# Altium integrated library HCxx.IntLib: 212 symbols (part 1 of 2) (continued)
## HC173 (continued)
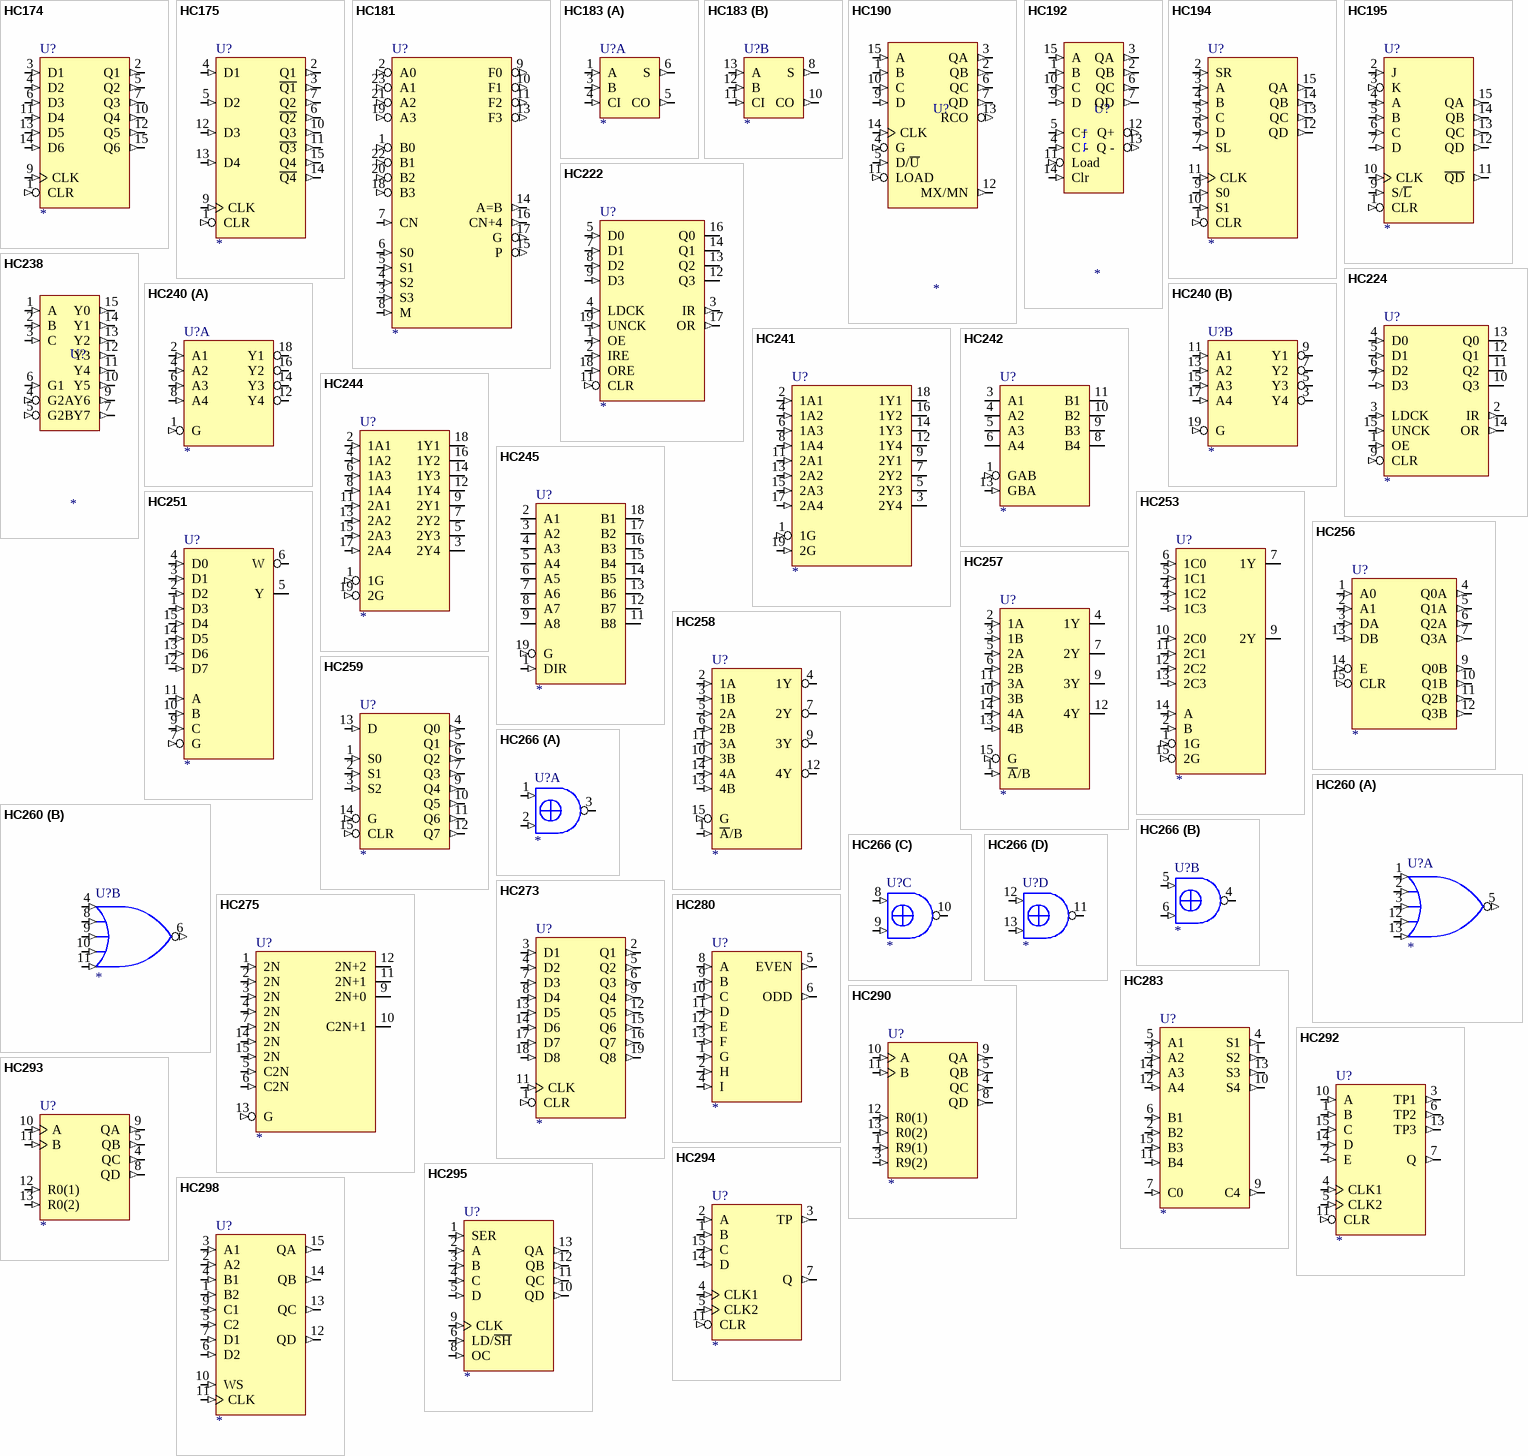
[diagram p4: symbols HC174 to HC298]

## HC174
designator U?
footprint DIL16-300
pins: 1 CLR (in), 2 Q1 (out), 3 D1 (in), 4 D2 (in), 5 Q2 (out), 6 D3 (in), 7 Q3 (out), 8 GND (power) hidden to GND, 9 CLK (in), 10 Q4 (out), 11 D4 (in), 12 Q5 (out), 13 D5 (in), 14 D6 (in), 15 Q6 (out), 16 VCC (power) hidden to VCC

## HC175
designator U?
footprint DIL16-300
pins: 1 CLR (in), 2 Q1 (out), 3 ~{Q1} (out), 4 D1 (in), 5 D2 (in), 6 ~{Q2} (out), 7 Q2 (out), 8 GND (power) hidden to GND, 9 CLK (in), 10 Q3 (out), 11 ~{Q3} (out), 12 D3 (in), 13 D4 (in), 14 ~{Q4} (out), 15 Q4 (out), 16 VCC (power) hidden to VCC

## HC181
designator U?
footprint DIL24-600
pins: 1 B0 (in), 2 A0 (in), 3 S3 (in), 4 S2 (in), 5 S1 (in), 6 S0 (in), 7 CN (in), 8 M (in), 9 F0 (out), 10 F1 (out), 11 F2 (out), 12 GND (power) hidden to GND, 13 F3 (out), 14 A=B (out), 15 P (out), 16 CN+4 (out), 17 G (out), 18 B3 (in), 19 A3 (in), 20 B2 (in), 21 A2 (in), 22 B1 (in), 23 A1 (in), 24 VCC (power) hidden to VCC

## HC183
designator U?
footprint DIL14-300
part A pins: 1 A (in), 3 B (in), 4 CI (in), 5 CO (out), 6 S (out), 7 GND (power) hidden to GND, 14 VCC (power) hidden to VCC
part B pins: 8 S (out), 10 CO (out), 11 CI (in), 12 B (in), 13 A (in)

## HC190
designator U?
footprint DIL16-300
pins: 1 B (in), 2 QB (out), 3 QA (out), 4 G (in), 5 D/~{U} (in), 6 QC (out), 7 QD (out), 8 GND (power) hidden to GND, 9 D (in), 10 C (in), 11 LOAD (in), 12 MX/MN (out), 13 RCO (out), 14 CLK (in), 15 A (in), 16 VCC (power) hidden to VCC

## HC192
designator U?
footprint DIL16-300
pins: 1 B (in), 2 QB (out), 3 QA (out), 4 C - (in), 5 C+ (in), 6 QC (out), 7 QD (out), 8 GND (power) hidden to GND, 9 D (in), 10 C (in), 11 Load (in), 12 Q+ (out), 13 Q - (out), 14 Clr (in), 15 A (in), 16 VCC (power) hidden to VCC

## HC194
designator U?
footprint DIL16-300
pins: 1 CLR (in), 2 SR (in), 3 A (in), 4 B (in), 5 C (in), 6 D (in), 7 SL (in), 8 GND (power) hidden to GND, 9 S0 (in), 10 S1 (in), 11 CLK (in), 12 QD (out), 13 QC (out), 14 QB (out), 15 QA (out), 16 VCC (power) hidden to VCC

## HC195
designator U?
footprint DIL16-300
pins: 1 CLR (in), 2 J (in), 3 K (in), 4 A (in), 5 B (in), 6 C (in), 7 D (in), 8 GND (power) hidden to GND, 9 S/~{L} (in), 10 CLK (in), 11 ~{QD} (out), 12 QD (out), 13 QC (out), 14 QB (out), 15 QA (out), 16 VCC (power) hidden to VCC

## HC222
designator U?
footprint DIL20-300
pins: 1 OE (in), 2 IRE (in), 3 IR (out), 4 LDCK (in), 5 D0 (in), 7 D1 (in), 8 D2 (in), 9 D3 (in), 10 GND (power) hidden to GND, 11 CLR (in), 12 Q3 (hiz), 13 Q2 (hiz), 14 Q1 (hiz), 16 Q0 (hiz), 17 OR (out), 18 ORE (in), 19 UNCK (in), 20 VCC (power) hidden to VCC

## HC224
designator U?
footprint DIL16-300
pins: 1 OE (in), 2 IR (out), 3 LDCK (in), 4 D0 (in), 5 D1 (in), 6 D2 (in), 7 D3 (in), 8 GND (power) hidden to GND, 9 CLR (in), 10 Q3 (hiz), 11 Q2 (hiz), 12 Q1 (hiz), 13 Q0 (hiz), 14 OR (out), 15 UNCK (in), 16 VCC (power) hidden to VCC

## HC238
designator U?
Price: 0.5
footprint DIL16-300
pins: 1 A (in), 2 B (in), 3 C (in), 4 G2A (in), 5 G2B (in), 6 G1 (in), 7 Y7 (out), 8 GND (power) hidden to GND, 9 Y6 (out), 10 Y5 (out), 11 Y4 (out), 12 Y3 (out), 13 Y2 (out), 14 Y1 (out), 15 Y0 (out), 16 VCC (power) hidden to VCC

## HC240
designator U?
footprint DIL20-300
part A pins: 1 G (in), 2 A1 (in), 4 A2 (in), 6 A3 (in), 8 A4 (in), 10 GND (power) hidden to GND, 12 Y4 (hiz), 14 Y3 (hiz), 16 Y2 (hiz), 18 Y1 (hiz), 20 VCC (power) hidden to VCC
part B pins: 3 Y4 (hiz), 5 Y3 (hiz), 7 Y2 (hiz), 9 Y1 (hiz), 11 A1 (in), 13 A2 (in), 15 A3 (in), 17 A4 (in), 19 G (in)

## HC241
designator U?
footprint DIL20-300
pins: 1 1G (in), 2 1A1 (in), 3 2Y4 (hiz), 4 1A2 (in), 5 2Y3 (hiz), 6 1A3 (in), 7 2Y2 (hiz), 8 1A4 (in), 9 2Y1 (hiz), 10 GND (power) hidden to GND, 11 2A1 (in), 12 1Y4 (hiz), 13 2A2 (in), 14 1Y3 (hiz), 15 2A3 (in), 16 1Y2 (hiz), 17 2A4 (in), 18 1Y1 (hiz), 19 2G (in), 20 VCC (power) hidden to VCC

## HC242
designator U?
footprint DIL20-300
pins: 1 GAB (in), 3 A1 (io), 4 A2 (io), 5 A3 (io), 6 A4 (io), 7 GND (power) hidden to GND, 8 B4 (io), 9 B3 (io), 10 B2 (io), 11 B1 (io), 13 GBA (in), 14 VCC (power) hidden to VCC

## HC244
designator U?
footprint DIL20-300
pins: 1 1G (in), 2 1A1 (in), 3 2Y4 (hiz), 4 1A2 (in), 5 2Y3 (hiz), 6 1A3 (in), 7 2Y2 (hiz), 8 1A4 (in), 9 2Y1 (hiz), 10 GND (power) hidden to GND, 11 2A1 (in), 12 1Y4 (hiz), 13 2A2 (in), 14 1Y3 (hiz), 15 2A3 (in), 16 1Y2 (hiz), 17 2A4 (in), 18 1Y1 (hiz), 19 2G (in), 20 VCC (power) hidden to VCC

## HC245
designator U?
footprint DIL20-300
pins: 1 DIR (in), 2 A1 (io), 3 A2 (io), 4 A3 (io), 5 A4 (io), 6 A5 (io), 7 A6 (io), 8 A7 (io), 9 A8 (io), 10 GND (power) hidden to GND, 11 B8 (io), 12 B7 (io), 13 B6 (io), 14 B5 (io), 15 B4 (io), 16 B3 (io), 17 B2 (io), 18 B1 (io), 19 G (in), 20 VCC (power) hidden to VCC

## HC251
designator U?
footprint DIL16-300
pins: 1 D3 (in), 2 D2 (in), 3 D1 (in), 4 D0 (in), 5 Y (hiz), 6 W (hiz), 7 G (in), 8 GND (power) hidden to GND, 9 C (in), 10 B (in), 11 A (in), 12 D7 (in), 13 D6 (in), 14 D5 (in), 15 D4 (in), 16 VCC (power) hidden to VCC

## HC253
designator U?
footprint DIL16-300
pins: 1 1G (in), 2 B (in), 3 1C3 (in), 4 1C2 (in), 5 1C1 (in), 6 1C0 (in), 7 1Y (hiz), 8 GND (power) hidden to GND, 9 2Y (hiz), 10 2C0 (in), 11 2C1 (in), 12 2C2 (in), 13 2C3 (in), 14 A (in), 15 2G (in), 16 VCC (power) hidden to VCC

## HC256
designator U?
footprint DIL16-300
pins: 1 A0 (in), 2 A1 (in), 3 DA (in), 4 Q0A (out), 5 Q1A (out), 6 Q2A (out), 7 Q3A (out), 8 GND (power) hidden to GND, 9 Q0B (out), 10 Q1B (out), 11 Q2B (out), 12 Q3B (out), 13 DB (in), 14 E (in), 15 CLR (in), 16 VCC (power) hidden to VCC

## HC257
designator U?
footprint DIL16-300
pins: 1 ~{A}/B (in), 2 1A (in), 3 1B (in), 4 1Y (hiz), 5 2A (in), 6 2B (in), 7 2Y (hiz), 8 GND (power) hidden to GND, 9 3Y (hiz), 10 3B (in), 11 3A (in), 12 4Y (hiz), 13 4B (in), 14 4A (in), 15 G (in), 16 VCC (power) hidden to VCC

## HC258
designator U?
footprint DIL16-300
pins: 1 ~{A}/B (in), 2 1A (in), 3 1B (in), 4 1Y (hiz), 5 2A (in), 6 2B (in), 7 2Y (hiz), 8 GND (power) hidden to GND, 9 3Y (hiz), 10 3B (in), 11 3A (in), 12 4Y (hiz), 13 4B (in), 14 4A (in), 15 G (in), 16 VCC (power) hidden to VCC

## HC259
designator U?
footprint DIL16-300
pins: 1 S0 (in), 2 S1 (in), 3 S2 (in), 4 Q0 (out), 5 Q1 (out), 6 Q2 (out), 7 Q3 (out), 8 GND (power) hidden to GND, 9 Q4 (out), 10 Q5 (out), 11 Q6 (out), 12 Q7 (out), 13 D (in), 14 G (in), 15 CLR (in), 16 VCC (power) hidden to VCC

## HC260
designator U?
footprint DIL14-300
part A pins: 1 I0 (in), 2 I1 (in), 3 I2 (in), 5 O (out), 7 GND (power) hidden to GND, 12 I3 (in), 13 I4 (in), 14 VCC (power) hidden to VCC
part B pins: 4 I0 (in), 6 O (out), 8 I1 (in), 9 I2 (in), 10 I3 (in), 11 I4 (in)
1 alternate drawing of the same symbol

## HC266
designator U?
footprint DIL14-300
part A pins: 1 I0 (in), 2 I1 (in), 3 O (oc), 7 GND (power) hidden to GND, 14 VCC (power) hidden to VCC
part B pins: 4 O (oc), 5 I0 (in), 6 I1 (in)
part C pins: 8 I0 (in), 9 I1 (in), 10 O (oc)
part D pins: 11 O (oc), 12 I0 (in), 13 I1 (in)

## HC273
designator U?
footprint DIL20-300
pins: 1 CLR (in), 2 Q1 (out), 3 D1 (in), 4 D2 (in), 5 Q2 (out), 6 Q3 (out), 7 D3 (in), 8 D4 (in), 9 Q4 (out), 10 GND (power) hidden to GND, 11 CLK (in), 12 Q5 (out), 13 D5 (in), 14 D6 (in), 15 Q6 (out), 16 Q7 (out), 17 D7 (in), 18 D8 (in), 19 Q8 (out), 20 VCC (power) hidden to VCC

## HC275
designator U?
footprint DIL16-300
pins: 1 2N (in), 2 2N (in), 3 2N (in), 4 2N (in), 5 C2N (in), 6 C2N (in), 7 2N (in), 8 GND (power) hidden to GND, 9 2N+0 (hiz), 10 C2N+1 (hiz), 11 2N+1 (hiz), 12 2N+2 (hiz), 13 G (in), 14 2N (in), 15 2N (in), 16 VCC (power) hidden to VCC

## HC280
designator U?
footprint DIL14-300
pins: 1 G (in), 2 H (in), 4 I (in), 5 EVEN (out), 6 ODD (out), 7 GND (power) hidden to GND, 8 A (in), 9 B (in), 10 C (in), 11 D (in), 12 E (in), 13 F (in), 14 VCC (power) hidden to VCC

## HC283
designator U?
footprint DIL16-300
pins: 1 S2 (out), 2 B2 (in), 3 A2 (in), 4 S1 (out), 5 A1 (in), 6 B1 (in), 7 C0 (in), 8 GND (power) hidden to GND, 9 C4 (out), 10 S4 (out), 11 B4 (in), 12 A4 (in), 13 S3 (out), 14 A3 (in), 15 B3 (in), 16 VCC (power) hidden to VCC

## HC290
designator U?
footprint DIL14-300
pins: 1 R9(1) (in), 3 R9(2) (in), 4 QC (out), 5 QB (out), 7 GND (power) hidden to GND, 8 QD (out), 9 QA (out), 10 A (in), 11 B (in), 12 R0(1) (in), 13 R0(2) (in), 14 VCC (power) hidden to VCC

## HC292
designator U?
footprint DIL16-300
pins: 1 B (in), 2 E (in), 3 TP1 (out), 4 CLK1 (in), 5 CLK2 (in), 6 TP2 (out), 7 Q (out), 8 GND (power) hidden to GND, 10 A (in), 11 CLR (in), 13 TP3 (out), 14 D (in), 15 C (in), 16 VCC (power) hidden to VCC

## HC293
designator U?
footprint DIL14-300
pins: 4 QC (out), 5 QB (out), 7 GND (power) hidden to GND, 8 QD (out), 9 QA (out), 10 A (in), 11 B (in), 12 R0(1) (in), 13 R0(2) (in), 14 VCC (power) hidden to VCC

## HC294
designator U?
footprint DIL16-300
pins: 1 B (in), 2 A (in), 3 TP (out), 4 CLK1 (in), 5 CLK2 (in), 7 Q (out), 8 GND (power) hidden to GND, 11 CLR (in), 14 D (in), 15 C (in), 16 VCC (power) hidden to VCC

## HC295
designator U?
footprint DIL14-300
pins: 1 SER (in), 2 A (in), 3 B (in), 4 C (in), 5 D (in), 6 LD/~{SH} (in), 7 GND (power) hidden to GND, 8 OC (in), 9 CLK (in), 10 QD (out), 11 QC (out), 12 QB (out), 13 QA (out), 14 VCC (power) hidden to VCC

## HC298
designator U?
footprint DIL16-300
pins: 1 B2 (in), 2 A2 (in), 3 A1 (in), 4 B1 (in), 5 C2 (in), 6 D2 (in), 7 D1 (in), 8 GND (power) hidden to GND, 9 C1 (in), 10 WS (in), 11 CLK (in), 12 QD (out), 13 QC (out), 14 QB (out), 15 QA (out), 16 VCC (power) hidden to VCC

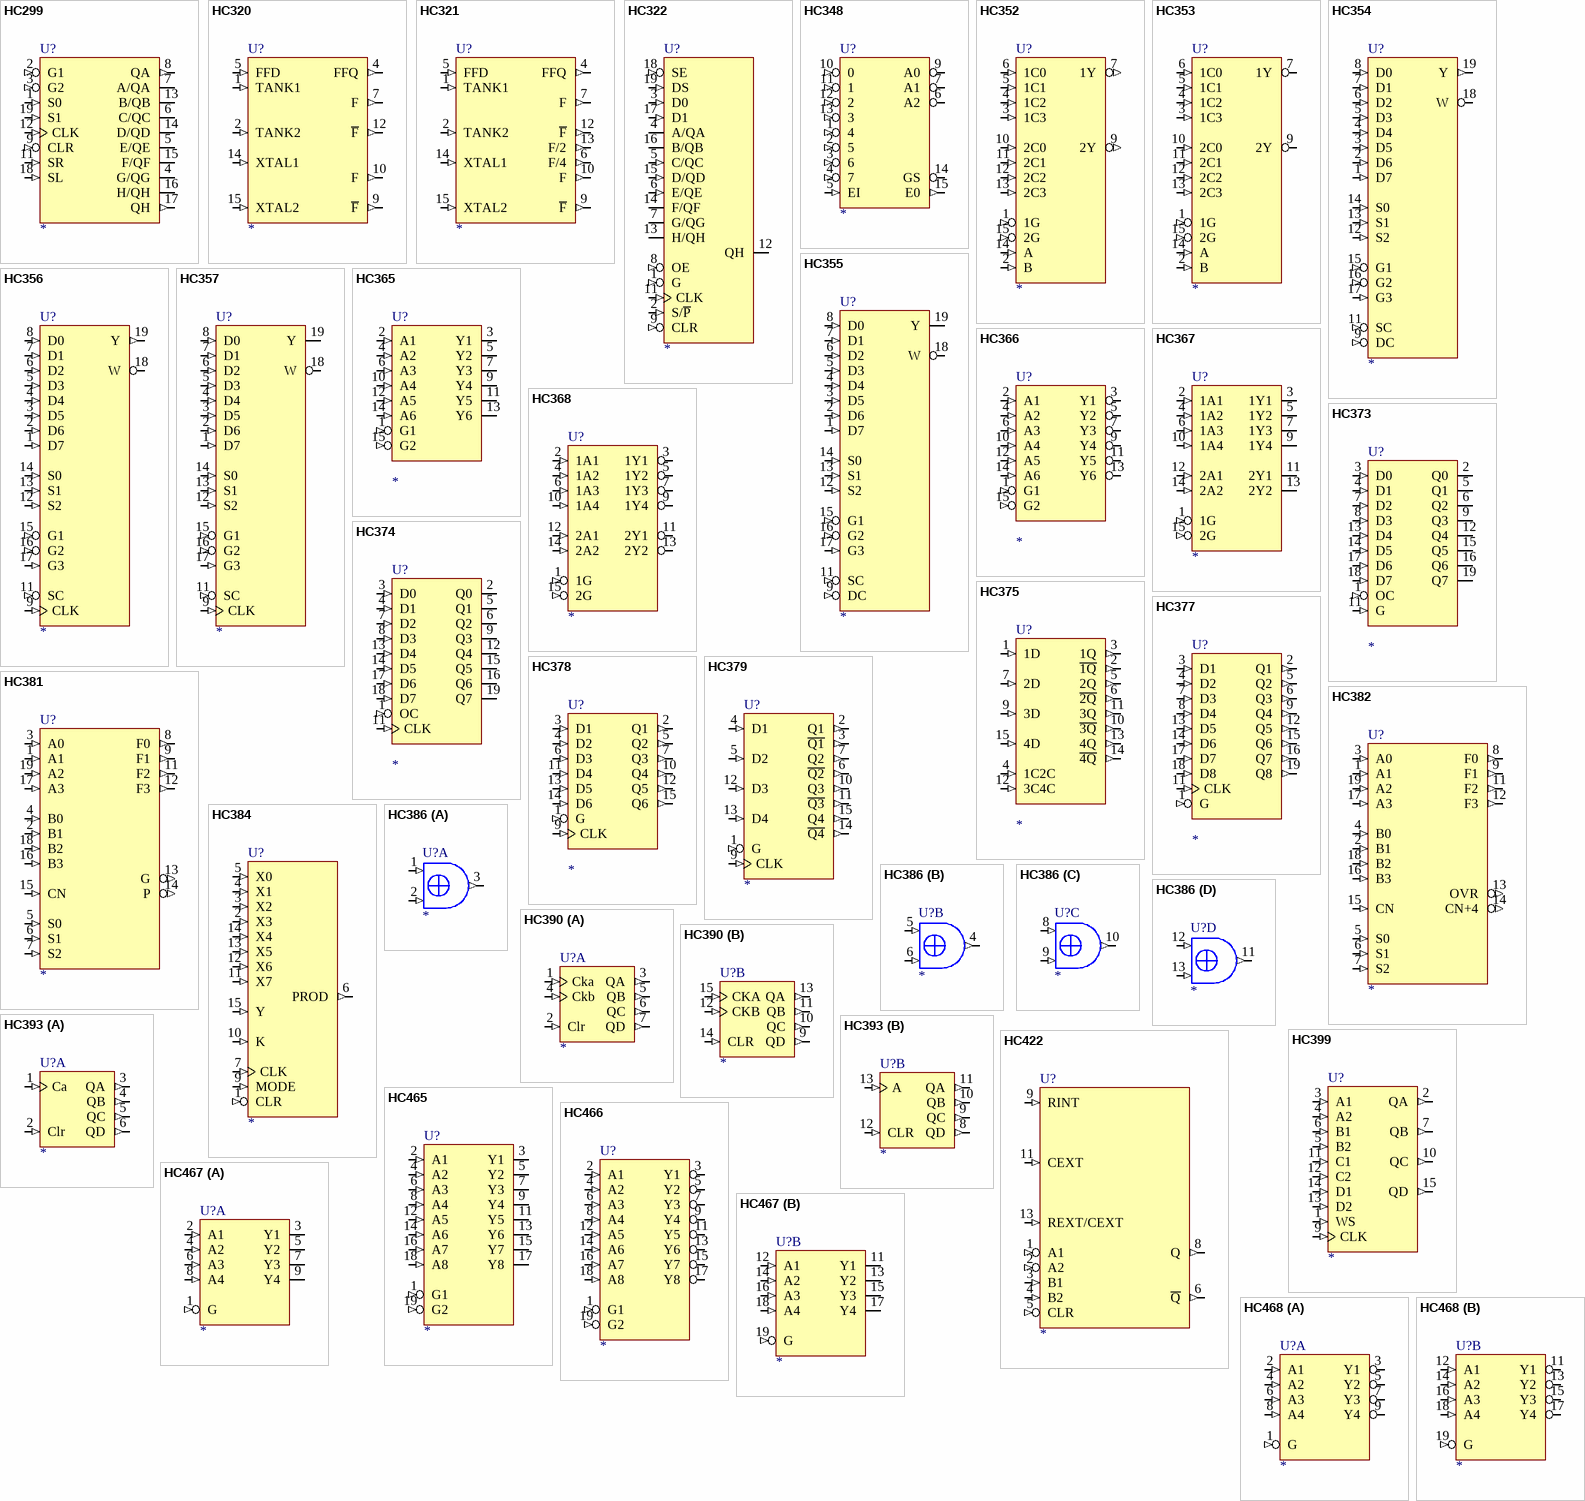
[diagram p5: symbols HC299 to HC468]

## HC299
designator U?
footprint DIL20-300
pins: 1 S0 (in), 2 G1 (in), 3 G2 (in), 4 G/QG (io), 5 E/QE (io), 6 C/QC (io), 7 A/QA (io), 8 QA (out), 9 CLR (in), 10 GND (power) hidden to GND, 11 SR (in), 12 CLK (in), 13 B/QB (io), 14 D/QD (io), 15 F/QF (io), 16 H/QH (io), 17 QH (out), 18 SL (in), 19 S1 (in), 20 VCC (power) hidden to VCC

## HC320
designator U?
footprint DIL16-300
pins: 1 TANK1 (in), 2 TANK2 (in), 4 FFQ (out), 5 FFD (in), 7 F (out), 8 GND (power) hidden to GND, 9 ~{F} (out), 10 F (out), 12 ~{F} (out), 14 XTAL1 (in), 15 XTAL2 (in), 16 VCC (power) hidden to VCC

## HC321
designator U?
footprint DIL16-300
pins: 1 TANK1 (in), 2 TANK2 (in), 4 FFQ (out), 5 FFD (in), 6 F/4 (out), 7 F (out), 8 GND (power) hidden to GND, 9 ~{F} (out), 10 F (out), 12 ~{F} (out), 13 F/2 (out), 14 XTAL1 (in), 15 XTAL2 (in), 16 VCC (power) hidden to VCC

## HC322
designator U?
footprint DIL20-300
pins: 1 G (in), 2 S/~{P} (in), 3 D0 (in), 4 A/QA (io), 5 C/QC (in), 6 E/QE (in), 7 G/QG (io), 8 OE (in), 9 CLR (in), 10 GND (power) hidden to GND, 11 CLK (in), 12 QH (hiz), 13 H/QH (io), 14 F/QF (io), 15 D/QD (in), 16 B/QB (io), 17 D1 (in), 18 SE (in), 19 DS (in), 20 VCC (power) hidden to VCC

## HC348
designator U?
footprint DIL16-300
pins: 1 4 (in), 2 5 (in), 3 6 (in), 4 7 (in), 5 EI (in), 6 A2 (hiz), 7 A1 (hiz), 8 GND (power) hidden to GND, 9 A0 (hiz), 10 0 (in), 11 1 (in), 12 2 (in), 13 3 (in), 14 GS (hiz), 15 E0 (out), 16 VCC (power) hidden to VCC

## HC352
designator U?
footprint DIL16-300
pins: 1 1G (in), 2 B (in), 3 1C3 (in), 4 1C2 (in), 5 1C1 (in), 6 1C0 (in), 7 1Y (out), 8 GND (power) hidden to GND, 9 2Y (out), 10 2C0 (in), 11 2C1 (in), 12 2C2 (in), 13 2C3 (in), 14 A (in), 15 2G (in), 16 VCC (power) hidden to VCC

## HC353
designator U?
footprint DIL16-300
pins: 1 1G (in), 2 B (in), 3 1C3 (in), 4 1C2 (in), 5 1C1 (in), 6 1C0 (in), 7 1Y (hiz), 8 GND (power) hidden to GND, 9 2Y (hiz), 10 2C0 (in), 11 2C1 (in), 12 2C2 (in), 13 2C3 (in), 14 A (in), 15 2G (in), 16 VCC (power) hidden to VCC

## HC354
designator U?
footprint DIL20-300
pins: 1 D7 (in), 2 D6 (in), 3 D5 (in), 4 D4 (in), 5 D3 (in), 6 D2 (in), 7 D1 (in), 8 D0 (in), 9 DC (in), 10 GND (power) hidden to GND, 11 SC (in), 12 S2 (in), 13 S1 (in), 14 S0 (in), 15 G1 (in), 16 G2 (in), 17 G3 (in), 18 W (hiz), 19 Y (out), 20 VCC (power) hidden to VCC

## HC355
designator U?
footprint DIL20-300
pins: 1 D7 (in), 2 D6 (in), 3 D5 (in), 4 D4 (in), 5 D3 (in), 6 D2 (in), 7 D1 (in), 8 D0 (in), 9 DC (in), 10 GND (power) hidden to GND, 11 SC (in), 12 S2 (in), 13 S1 (in), 14 S0 (in), 15 G1 (in), 16 G2 (in), 17 G3 (in), 18 W (oc), 19 Y (oc), 20 VCC (power) hidden to VCC

## HC356
designator U?
footprint DIL20-300
pins: 1 D7 (in), 2 D6 (in), 3 D5 (in), 4 D4 (in), 5 D3 (in), 6 D2 (in), 7 D1 (in), 8 D0 (in), 9 CLK (in), 10 GND (power) hidden to GND, 11 SC (in), 12 S2 (in), 13 S1 (in), 14 S0 (in), 15 G1 (in), 16 G2 (in), 17 G3 (in), 18 W (hiz), 19 Y (out), 20 VCC (power) hidden to VCC

## HC357
designator U?
footprint DIL20-3000
pins: 1 D7 (in), 2 D6 (in), 3 D5 (in), 4 D4 (in), 5 D3 (in), 6 D2 (in), 7 D1 (in), 8 D0 (in), 9 CLK (in), 10 GND (power) hidden to GND, 11 SC (in), 12 S2 (in), 13 S1 (in), 14 S0 (in), 15 G1 (in), 16 G2 (in), 17 G3 (in), 18 W (oc), 19 Y (oc), 20 VCC (power) hidden to VCC

## HC365
designator U?
footprint DIL16-300
pins: 1 G1 (in), 2 A1 (in), 3 Y1 (hiz), 4 A2 (in), 5 Y2 (hiz), 6 A3 (in), 7 Y3 (hiz), 8 GND (power) hidden to GND, 9 Y4 (hiz), 10 A4 (in), 11 Y5 (hiz), 12 A5 (in), 13 Y6 (hiz), 14 A6 (in), 15 G2 (in), 16 VCC (power) hidden to VCC

## HC366
designator U?
footprint DIL16-300
pins: 1 G1 (in), 2 A1 (in), 3 Y1 (hiz), 4 A2 (in), 5 Y2 (hiz), 6 A3 (in), 7 Y3 (hiz), 8 GND (power) hidden to GND, 9 Y4 (hiz), 10 A4 (in), 11 Y5 (hiz), 12 A5 (in), 13 Y6 (hiz), 14 A6 (in), 15 G2 (in), 16 VCC (power) hidden to VCC

## HC367
designator U?
footprint DIL16-300
pins: 1 1G (in), 2 1A1 (in), 3 1Y1 (hiz), 4 1A2 (in), 5 1Y2 (hiz), 6 1A3 (in), 7 1Y3 (hiz), 8 GND (power) hidden to GND, 9 1Y4 (hiz), 10 1A4 (in), 11 2Y1 (hiz), 12 2A1 (in), 13 2Y2 (hiz), 14 2A2 (in), 15 2G (in), 16 VCC (power) hidden to VCC

## HC368
designator U?
footprint DIL16-300
pins: 1 1G (in), 2 1A1 (in), 3 1Y1 (hiz), 4 1A2 (in), 5 1Y2 (hiz), 6 1A3 (in), 7 1Y3 (hiz), 8 GND (power) hidden to GND, 9 1Y4 (hiz), 10 1A4 (in), 11 2Y1 (hiz), 12 2A1 (in), 13 2Y2 (hiz), 14 2A2 (in), 15 2G (in), 16 VCC (power) hidden to VCC

## HC373
designator U?
footprint DIL20-300
pins: 1 OC (in), 2 Q0 (hiz), 3 D0 (in), 4 D1 (in), 5 Q1 (hiz), 6 Q2 (hiz), 7 D2 (in), 8 D3 (in), 9 Q3 (hiz), 10 GND (power) hidden to GND, 11 G (in), 12 Q4 (hiz), 13 D4 (in), 14 D5 (in), 15 Q5 (hiz), 16 Q6 (hiz), 17 D6 (in), 18 D7 (in), 19 Q7 (hiz), 20 VCC (power) hidden to VCC

## HC374
designator U?
footprint DIL20-300
pins: 1 OC (in), 2 Q0 (hiz), 3 D0 (in), 4 D1 (in), 5 Q1 (hiz), 6 Q2 (hiz), 7 D2 (in), 8 D3 (in), 9 Q3 (hiz), 10 GND (power) hidden to GND, 11 CLK (in), 12 Q4 (hiz), 13 D4 (in), 14 D5 (in), 15 Q5 (hiz), 16 Q6 (hiz), 17 D6 (in), 18 D7 (in), 19 Q7 (hiz), 20 VCC (power) hidden to VCC

## HC375
designator U?
footprint DIL16-300
pins: 1 1D (in), 2 ~{1Q} (out), 3 1Q (out), 4 1C2C (in), 5 2Q (out), 6 ~{2Q} (out), 7 2D (in), 8 GND (power) hidden to GND, 9 3D (in), 10 ~{3Q} (out), 11 3Q (out), 12 3C4C (in), 13 4Q (out), 14 ~{4Q} (out), 15 4D (in), 16 VCC (power) hidden to VCC

## HC377
designator U?
footprint DIL20-300
pins: 1 G (in), 2 Q1 (out), 3 D1 (in), 4 D2 (in), 5 Q2 (out), 6 Q3 (out), 7 D3 (in), 8 D4 (in), 9 Q4 (out), 10 GND (power) hidden to GND, 11 CLK (in), 12 Q5 (out), 13 D5 (in), 14 D6 (in), 15 Q6 (out), 16 Q7 (out), 17 D7 (in), 18 D8 (in), 19 Q8 (out), 20 VCC (power) hidden to VCC

## HC378
designator U?
footprint DIL16-300
pins: 1 G (in), 2 Q1 (out), 3 D1 (in), 4 D2 (in), 5 Q2 (out), 6 D3 (in), 7 Q3 (out), 8 GND (power) hidden to GND, 9 CLK (in), 10 Q4 (out), 11 D4 (in), 12 Q5 (out), 13 D5 (in), 14 D6 (in), 15 Q6 (out), 16 VCC (power) hidden to VCC

## HC379
designator U?
footprint DIL16-300
pins: 1 G (in), 2 Q1 (out), 3 ~{Q1} (out), 4 D1 (in), 5 D2 (in), 6 ~{Q2} (out), 7 Q2 (out), 8 GND (power) hidden to GND, 9 CLK (in), 10 Q3 (out), 11 ~{Q3} (out), 12 D3 (in), 13 D4 (in), 14 ~{Q4} (out), 15 Q4 (out), 16 VCC (power) hidden to VCC

## HC381
designator U?
footprint DIL20-300
pins: 1 A1 (in), 2 B1 (in), 3 A0 (in), 4 B0 (in), 5 S0 (in), 6 S1 (in), 7 S2 (in), 8 F0 (out), 9 F1 (out), 10 GND (power) hidden to GND, 11 F2 (out), 12 F3 (out), 13 G (out), 14 P (out), 15 CN (in), 16 B3 (in), 17 A3 (in), 18 B2 (in), 19 A2 (in), 20 VCC (power) hidden to VCC

## HC382
designator U?
footprint DIL20-300
pins: 1 A1 (in), 2 B1 (in), 3 A0 (in), 4 B0 (in), 5 S0 (in), 6 S1 (in), 7 S2 (in), 8 F0 (out), 9 F1 (out), 10 GND (power) hidden to GND, 11 F2 (out), 12 F3 (out), 13 OVR (out), 14 CN+4 (out), 15 CN (in), 16 B3 (in), 17 A3 (in), 18 B2 (in), 19 A2 (in), 20 VCC (power) hidden to VCC

## HC384
designator U?
footprint DIL16-300
pins: 1 CLR (in), 2 X3 (in), 3 X2 (in), 4 X1 (in), 5 X0 (in), 6 PROD (out), 7 CLK (in), 8 GND (power) hidden to GND, 9 MODE (in), 10 K (in), 11 X7 (in), 12 X6 (in), 13 X5 (in), 14 X4 (in), 15 Y (in), 16 VCC (power) hidden to VCC

## HC386
designator U?
footprint DIL14-300
part A pins: 1 I0 (in), 2 I1 (in), 3 O (out), 7 GND (power) hidden to GND, 14 VCC (power) hidden to VCC
part B pins: 4 O (out), 5 I0 (in), 6 I1 (in)
part C pins: 8 I0 (in), 9 I1 (in), 10 O (out)
part D pins: 11 O (out), 12 I0 (in), 13 I1 (in)

## HC390
designator U?
footprint DIL16-300
part A pins: 1 Cka (in), 2 Clr (in), 3 QA (out), 4 Ckb (in), 5 QB (out), 6 QC (out), 7 QD (out), 8 GND (power) hidden to GND, 16 VCC (power) hidden to VCC
part B pins: 9 QD (out), 10 QC (out), 11 QB (out), 12 CKB (in), 13 QA (out), 14 CLR (in), 15 CKA (in)

## HC393
designator U?
footprint DIL14-300
part A pins: 1 Ca (in), 2 Clr (in), 3 QA (out), 4 QB (out), 5 QC (out), 6 QD (out), 7 GND (power) hidden to GND, 14 VCC (power) hidden to VCC
part B pins: 8 QD (out), 9 QC (out), 10 QB (out), 11 QA (out), 12 CLR (in), 13 A (in)

## HC399
designator U?
footprint DIL16-300
pins: 1 WS (in), 2 QA (out), 3 A1 (in), 4 A2 (in), 5 B2 (in), 6 B1 (in), 7 QB (out), 8 GND (power) hidden to GND, 9 CLK (in), 10 QC (out), 11 C1 (in), 12 C2 (in), 13 D2 (in), 14 D1 (in), 15 QD (out), 16 VCC (power) hidden to VCC

## HC422
designator U?
footprint DIL14-300
pins: 1 A1 (in), 2 A2 (in), 3 B1 (in), 4 B2 (in), 5 CLR (in), 6 ~{Q} (out), 7 GND (power) hidden to GND, 8 Q (out), 9 RINT (in), 11 CEXT (in), 13 REXT/CEXT (in), 14 VCC (power) hidden to VCC

## HC465
designator U?
footprint DIL20-300
pins: 1 G1 (in), 2 A1 (in), 3 Y1 (hiz), 4 A2 (in), 5 Y2 (hiz), 6 A3 (in), 7 Y3 (hiz), 8 A4 (in), 9 Y4 (hiz), 10 GND (power) hidden to GND, 11 Y5 (hiz), 12 A5 (in), 13 Y6 (hiz), 14 A6 (in), 15 Y7 (hiz), 16 A7 (in), 17 Y8 (hiz), 18 A8 (in), 19 G2 (in), 20 VCC (power) hidden to VCC

## HC466
designator U?
footprint DIL20-300
pins: 1 G1 (in), 2 A1 (in), 3 Y1 (hiz), 4 A2 (in), 5 Y2 (hiz), 6 A3 (in), 7 Y3 (hiz), 8 A4 (in), 9 Y4 (hiz), 10 GND (power) hidden to GND, 11 Y5 (hiz), 12 A5 (in), 13 Y6 (hiz), 14 A6 (in), 15 Y7 (hiz), 16 A7 (in), 17 Y8 (hiz), 18 A8 (in), 19 G2 (in), 20 VCC (power) hidden to VCC

## HC467
designator U?
footprint DIL20-300
part A pins: 1 G (in), 2 A1 (in), 3 Y1 (hiz), 4 A2 (in), 5 Y2 (hiz), 6 A3 (in), 7 Y3 (hiz), 8 A4 (in), 9 Y4 (hiz), 10 GND (power) hidden to GND, 20 VCC (power) hidden to VCC
part B pins: 11 Y1 (hiz), 12 A1 (in), 13 Y2 (hiz), 14 A2 (in), 15 Y3 (hiz), 16 A3 (in), 17 Y4 (hiz), 18 A4 (in), 19 G (in)

## HC468
designator U?
footprint DIL20-300
part A pins: 1 G (in), 2 A1 (in), 3 Y1 (hiz), 4 A2 (in), 5 Y2 (hiz), 6 A3 (in), 7 Y3 (hiz), 8 A4 (in), 9 Y4 (hiz), 10 GND (power) hidden to GND, 20 VCC (power) hidden to VCC
part B pins: 11 Y1 (hiz), 12 A1 (in), 13 Y2 (hiz), 14 A2 (in), 15 Y3 (hiz), 16 A3 (in), 17 Y4 (hiz), 18 A4 (in), 19 G (in)

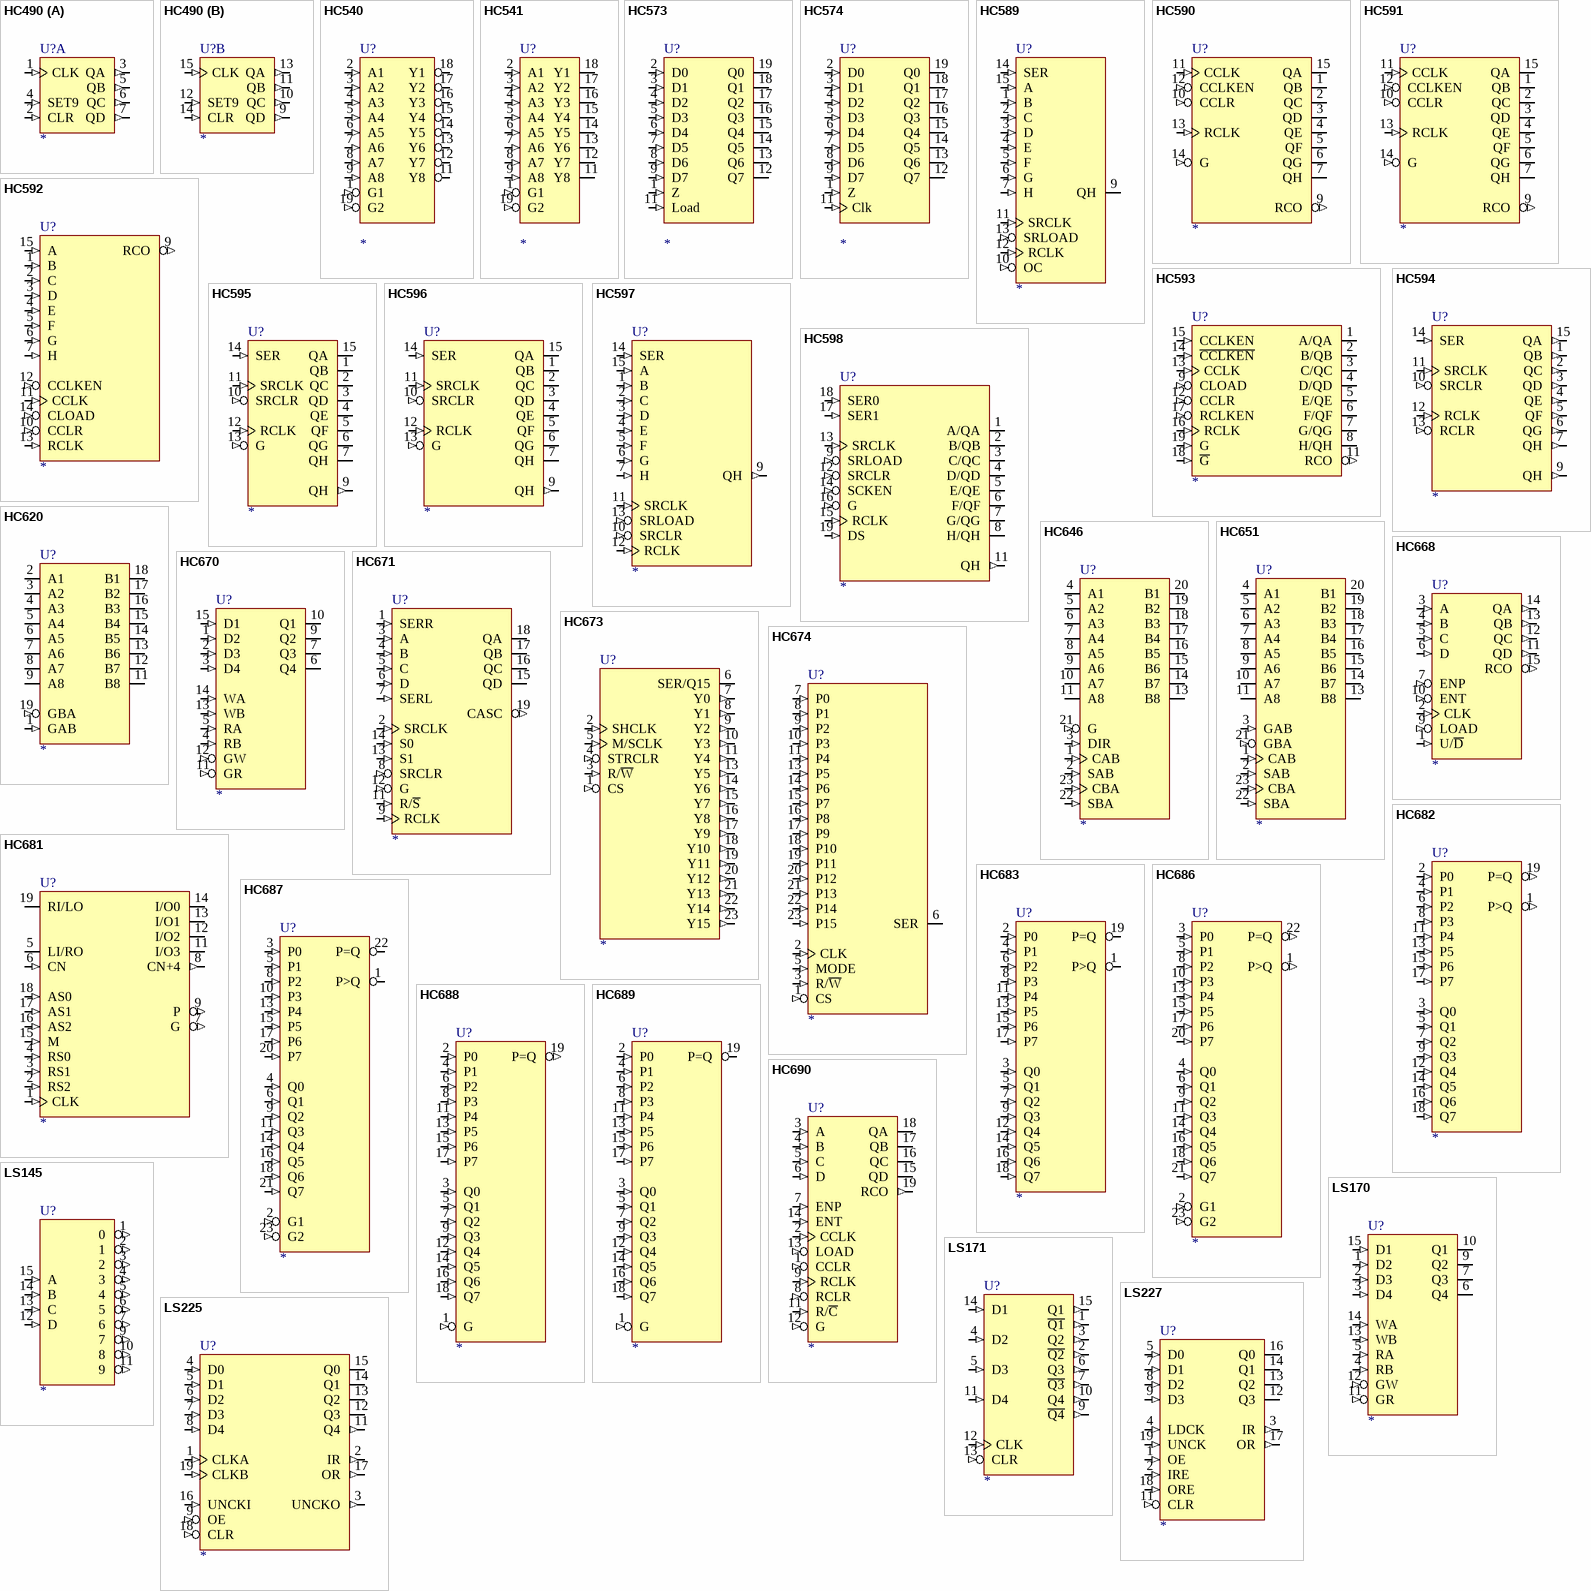
[diagram p6: symbols HC490 to LS227]

## HC490
designator U?
footprint DIL14-300
part A pins: 1 CLK (in), 2 CLR (in), 3 QA (out), 4 SET9 (in), 5 QB (out), 6 QC (out), 7 QD (out), 8 GND (power) hidden to GND, 16 VCC (power) hidden to VCC
part B pins: 9 QD (out), 10 QC (out), 11 QB (out), 12 SET9 (in), 13 QA (out), 14 CLR (in), 15 CLK (in)

## HC540
designator U?
footprint DIL20-300
pins: 1 G1 (in), 2 A1 (in), 3 A2 (in), 4 A3 (in), 5 A4 (in), 6 A5 (in), 7 A6 (in), 8 A7 (in), 9 A8 (in), 10 GND (power) hidden to GND, 11 Y8 (hiz), 12 Y7 (hiz), 13 Y6 (hiz), 14 Y5 (hiz), 15 Y4 (hiz), 16 Y3 (hiz), 17 Y2 (hiz), 18 Y1 (hiz), 19 G2 (in), 20 VCC (power) hidden to VCC

## HC541
designator U?
footprint DIL20-300
pins: 1 G1 (in), 2 A1 (in), 3 A2 (in), 4 A3 (in), 5 A4 (in), 6 A5 (in), 7 A6 (in), 8 A7 (in), 9 A8 (in), 10 GND (power) hidden to GND, 11 Y8 (hiz), 12 Y7 (hiz), 13 Y6 (hiz), 14 Y5 (hiz), 15 Y4 (hiz), 16 Y3 (hiz), 17 Y2 (hiz), 18 Y1 (hiz), 19 G2 (in), 20 VCC (power) hidden to VCC

## HC573
designator U?
footprint DIL20-300
pins: 1 Z (in), 2 D0 (in), 3 D1 (in), 4 D2 (in), 5 D3 (in), 6 D4 (in), 7 D5 (in), 8 D6 (in), 9 D7 (in), 10 GND (power) hidden to GND, 11 Load (in), 12 Q7 (hiz), 13 Q6 (hiz), 14 Q5 (hiz), 15 Q4 (hiz), 16 Q3 (hiz), 17 Q2 (hiz), 18 Q1 (hiz), 19 Q0 (hiz), 20 VCC (power) hidden to VCC

## HC574
designator U?
footprint DIL20-300
pins: 1 Z (in), 2 D0 (in), 3 D1 (in), 4 D2 (in), 5 D3 (in), 6 D4 (in), 7 D5 (in), 8 D6 (in), 9 D7 (in), 10 GND (power) hidden to GND, 11 Clk (in), 12 Q7 (hiz), 13 Q6 (hiz), 14 Q5 (hiz), 15 Q4 (hiz), 16 Q3 (hiz), 17 Q2 (hiz), 18 Q1 (hiz), 19 Q0 (hiz), 20 VCC (power) hidden to VCC

## HC589
designator U?
footprint DIL16-300
pins: 1 B (in), 2 C (in), 3 D (in), 4 E (in), 5 F (in), 6 G (in), 7 H (in), 8 GND (power) hidden to GND, 9 QH (hiz), 10 OC (in), 11 SRCLK (in), 12 RCLK (in), 13 SRLOAD (in), 14 SER (in), 15 A (in), 16 VCC (power) hidden to VCC

## HC590
designator U?
footprint DIL16-300
pins: 1 QB (hiz), 2 QC (hiz), 3 QD (hiz), 4 QE (hiz), 5 QF (hiz), 6 QG (hiz), 7 QH (hiz), 8 GND (power) hidden to GND, 9 RCO (out), 10 CCLR (in), 11 CCLK (in), 12 CCLKEN (in), 13 RCLK (in), 14 G (in), 15 QA (hiz), 16 VCC (power) hidden to VCC

## HC591
designator U?
footprint DIL16-300
pins: 1 QB (oc), 2 QC (oc), 3 QD (oc), 4 QE (oc), 5 QF (oc), 6 QG (oc), 7 QH (oc), 8 GND (power) hidden to GND, 9 RCO (out), 10 CCLR (in), 11 CCLK (in), 12 CCLKEN (in), 13 RCLK (in), 14 G (in), 15 QA (oc), 16 VCC (power) hidden to VCC

## HC592
designator U?
footprint DIL16-300
pins: 1 B (in), 2 C (in), 3 D (in), 4 E (in), 5 F (in), 6 G (in), 7 H (in), 8 GND (power) hidden to GND, 9 RCO (out), 10 CCLR (in), 11 CCLK (in), 12 CCLKEN (in), 13 RCLK (in), 14 CLOAD (in), 15 A (in), 16 VCC (power) hidden to VCC

## HC593
designator U?
footprint DIL20-300
pins: 1 A/QA (io), 2 B/QB (io), 3 C/QC (io), 4 D/QD (io), 5 E/QE (io), 6 F/QF (io), 7 G/QG (io), 8 H/QH (io), 9 CLOAD (in), 10 GND (power) hidden to GND, 11 RCO (out), 12 CCLR (in), 13 CCLK (in), 14 ~{CCLKEN} (in), 15 CCLKEN (in), 16 RCLK (in), 17 RCLKEN (in), 18 ~{G} (in), 19 G (in), 20 VCC (power) hidden to VCC

## HC594
designator U?
footprint DIL16-300
pins: 1 QB (out), 2 QC (out), 3 QD (out), 4 QE (out), 5 QF (out), 6 QG (out), 7 QH (out), 8 GND (power) hidden to GND, 9 QH (out), 10 SRCLR (in), 11 SRCLK (in), 12 RCLK (in), 13 RCLR (in), 14 SER (in), 15 QA (out), 16 VCC (power) hidden to VCC

## HC595
designator U?
footprint DIL16-300
pins: 1 QB (hiz), 2 QC (hiz), 3 QD (hiz), 4 QE (hiz), 5 QF (hiz), 6 QG (hiz), 7 QH (hiz), 8 GND (power) hidden to GND, 9 QH (out), 10 SRCLR (in), 11 SRCLK (in), 12 RCLK (in), 13 G (in), 14 SER (in), 15 QA (hiz), 16 VCC (power) hidden to VCC

## HC596
designator U?
footprint DIL16-300
pins: 1 QB (oc), 2 QC (oc), 3 QD (oc), 4 QE (oc), 5 QF (oc), 6 QG (oc), 7 QH (oc), 8 GND (power) hidden to GND, 9 QH (out), 10 SRCLR (in), 11 SRCLK (in), 12 RCLK (in), 13 G (in), 14 SER (in), 15 QA (oc), 16 VCC (power) hidden to VCC

## HC597
designator U?
footprint DIL16-300
pins: 1 B (in), 2 C (in), 3 D (in), 4 E (in), 5 F (in), 6 G (in), 7 H (in), 8 GND (power) hidden to GND, 9 QH (out), 10 SRCLR (in), 11 SRCLK (in), 12 RCLK (in), 13 SRLOAD (in), 14 SER (in), 15 A (in), 16 VCC (power) hidden to VCC

## HC598
designator U?
footprint DIL20-300
pins: 1 A/QA (io), 2 B/QB (io), 3 C/QC (io), 4 D/QD (io), 5 E/QE (io), 6 F/QF (io), 7 G/QG (io), 8 H/QH (io), 9 SRLOAD (in), 10 GND (power) hidden to GND, 11 QH (out), 12 SRCLR (in), 13 SRCLK (in), 14 SCKEN (in), 15 RCLK (in), 16 G (in), 17 SER1 (in), 18 SER0 (in), 19 DS (in), 20 VCC (power) hidden to VCC

## HC620
designator U?
footprint DIL20-300
pins: 1 GAB (in), 2 A1 (io), 3 A2 (io), 4 A3 (io), 5 A4 (io), 6 A5 (io), 7 A6 (io), 8 A7 (io), 9 A8 (io), 10 GND (power) hidden to GND, 11 B8 (io), 12 B7 (io), 13 B6 (io), 14 B5 (io), 15 B4 (io), 16 B3 (io), 17 B2 (io), 18 B1 (io), 19 GBA (in), 20 VCC (power) hidden to VCC

## HC646
designator U?
footprint DIL24-300 (Footprint not found)
pins: 1 CAB (in), 2 SAB (in), 3 DIR (in), 4 A1 (io), 5 A2 (io), 6 A3 (io), 7 A4 (io), 8 A5 (io), 9 A6 (io), 10 A7 (io), 11 A8 (io), 12 GND (power) hidden to GND, 13 B8 (io), 14 B7 (io), 15 B6 (io), 16 B5 (io), 17 B4 (io), 18 B3 (io), 19 B2 (io), 20 B1 (io), 21 G (in), 22 SBA (in), 23 CBA (in), 24 VCC (power) hidden to VCC

## HC651
designator U?
footprint DIL24-300 (Footprint not found)
pins: 1 CAB (in), 2 SAB (in), 3 GAB (in), 4 A1 (io), 5 A2 (io), 6 A3 (io), 7 A4 (io), 8 A5 (io), 9 A6 (io), 10 A7 (io), 11 A8 (io), 12 GND (power) hidden to GND, 13 B8 (io), 14 B7 (io), 15 B6 (io), 16 B5 (io), 17 B4 (io), 18 B3 (io), 19 B2 (io), 20 B1 (io), 21 GBA (in), 22 SBA (in), 23 CBA (in), 24 VCC (power) hidden to VCC

## HC668
designator U?
footprint DIL24-300 (Footprint not found)
pins: 1 U/~{D} (in), 2 CLK (in), 3 A (in), 4 B (in), 5 C (in), 6 D (in), 7 ENP (in), 8 GND (power) hidden to GND, 9 LOAD (in), 10 ENT (in), 11 QD (out), 12 QC (out), 13 QB (out), 14 QA (out), 15 RCO (out), 16 VCC (power) hidden to VCC

## HC670
designator U?
footprint DIL16-300
pins: 1 D2 (in), 2 D3 (in), 3 D4 (in), 4 RB (in), 5 RA (in), 6 Q4 (hiz), 7 Q3 (hiz), 8 GND (power) hidden to GND, 9 Q2 (hiz), 10 Q1 (hiz), 11 GR (in), 12 GW (in), 13 WB (in), 14 WA (in), 15 D1 (in), 16 VCC (power) hidden to VCC

## HC671
designator U?
footprint DIL20-300
pins: 1 SERR (in), 2 SRCLK (in), 3 A (in), 4 B (in), 5 C (in), 6 D (in), 7 SERL (in), 8 SRCLR (in), 9 RCLK (in), 10 GND (power) hidden to GND, 11 R/~{S} (in), 12 G (in), 13 S1 (in), 14 S0 (in), 15 QD (hiz), 16 QC (hiz), 17 QB (hiz), 18 QA (hiz), 19 CASC (out), 20 VCC (power) hidden to VCC

## HC673
designator U?
footprint DIL24-300 (Footprint not found)
pins: 1 CS (in), 2 SHCLK (in), 3 R/~{W} (in), 4 STRCLR (in), 5 M/SCLK (in), 6 SER/Q15 (io), 7 Y0 (out), 8 Y1 (out), 9 Y2 (out), 10 Y3 (out), 11 Y4 (out), 12 GND (power) hidden to GND, 13 Y5 (out), 14 Y6 (out), 15 Y7 (out), 16 Y8 (out), 17 Y9 (out), 18 Y10 (out), 19 Y11 (out), 20 Y12 (out), 21 Y13 (out), 22 Y14 (out), 23 Y15 (out), 24 VCC (power) hidden to VCC

## HC674
designator U?
footprint DIL24-300 (Footprint not found)
pins: 1 CS (in), 2 CLK (in), 3 R/~{W} (in), 5 MODE (in), 6 SER (io), 7 P0 (in), 8 P1 (in), 9 P2 (in), 10 P3 (in), 11 P4 (in), 12 GND (power) hidden to GND, 13 P5 (in), 14 P6 (in), 15 P7 (in), 16 P8 (in), 17 P9 (in), 18 P10 (in), 19 P11 (in), 20 P12 (in), 21 P13 (in), 22 P14 (in), 23 P15 (in), 24 VCC (power) hidden to VCC

## HC681
designator U?
footprint DIL20-300
pins: 1 CLK (in), 2 RS2 (in), 3 RS1 (in), 4 RS0 (in), 5 LI/RO (io), 6 CN (in), 7 G (out), 8 CN+4 (out), 9 P (out), 10 GND (power) hidden to GND, 11 I/O3 (io), 12 I/O2 (io), 13 I/O1 (io), 14 I/O0 (io), 15 M (in), 16 AS2 (in), 17 AS1 (in), 18 AS0 (in), 19 RI/LO (io), 20 VCC (power) hidden to VCC

## HC682
designator U?
footprint DIL20-300
pins: 1 P>Q (out), 2 P0 (in), 3 Q0 (in), 4 P1 (in), 5 Q1 (in), 6 P2 (in), 7 Q2 (in), 8 P3 (in), 9 Q3 (in), 10 GND (power) hidden to GND, 11 P4 (in), 12 Q4 (in), 13 P5 (in), 14 Q5 (in), 15 P6 (in), 16 Q6 (in), 17 P7 (in), 18 Q7 (in), 19 P=Q (out), 20 VCC (power) hidden to VCC

## HC683
designator U?
footprint DIL20-300
pins: 1 P>Q (oc), 2 P0 (in), 3 Q0 (in), 4 P1 (in), 5 Q1 (in), 6 P2 (in), 7 Q2 (in), 8 P3 (in), 9 Q3 (in), 10 GND (power) hidden to GND, 11 P4 (in), 12 Q4 (in), 13 P5 (in), 14 Q5 (in), 15 P6 (in), 16 Q6 (in), 17 P7 (in), 18 Q7 (in), 19 P=Q (oc), 20 VCC (power) hidden to VCC